# Altium footprint library ICs_rus.PCBLIB: 103 footprints (part 3 of 7)
Each footprint in its own frame and in the unit in brackets; x right, y up, seen from the top. Pads: shape width x height; smd on the part's side, far side on the other; paste and mask are expansions set on the pad; w line width, h text height; cw(c..) or ccw(c..) is an arc to the next point about the centre after c.
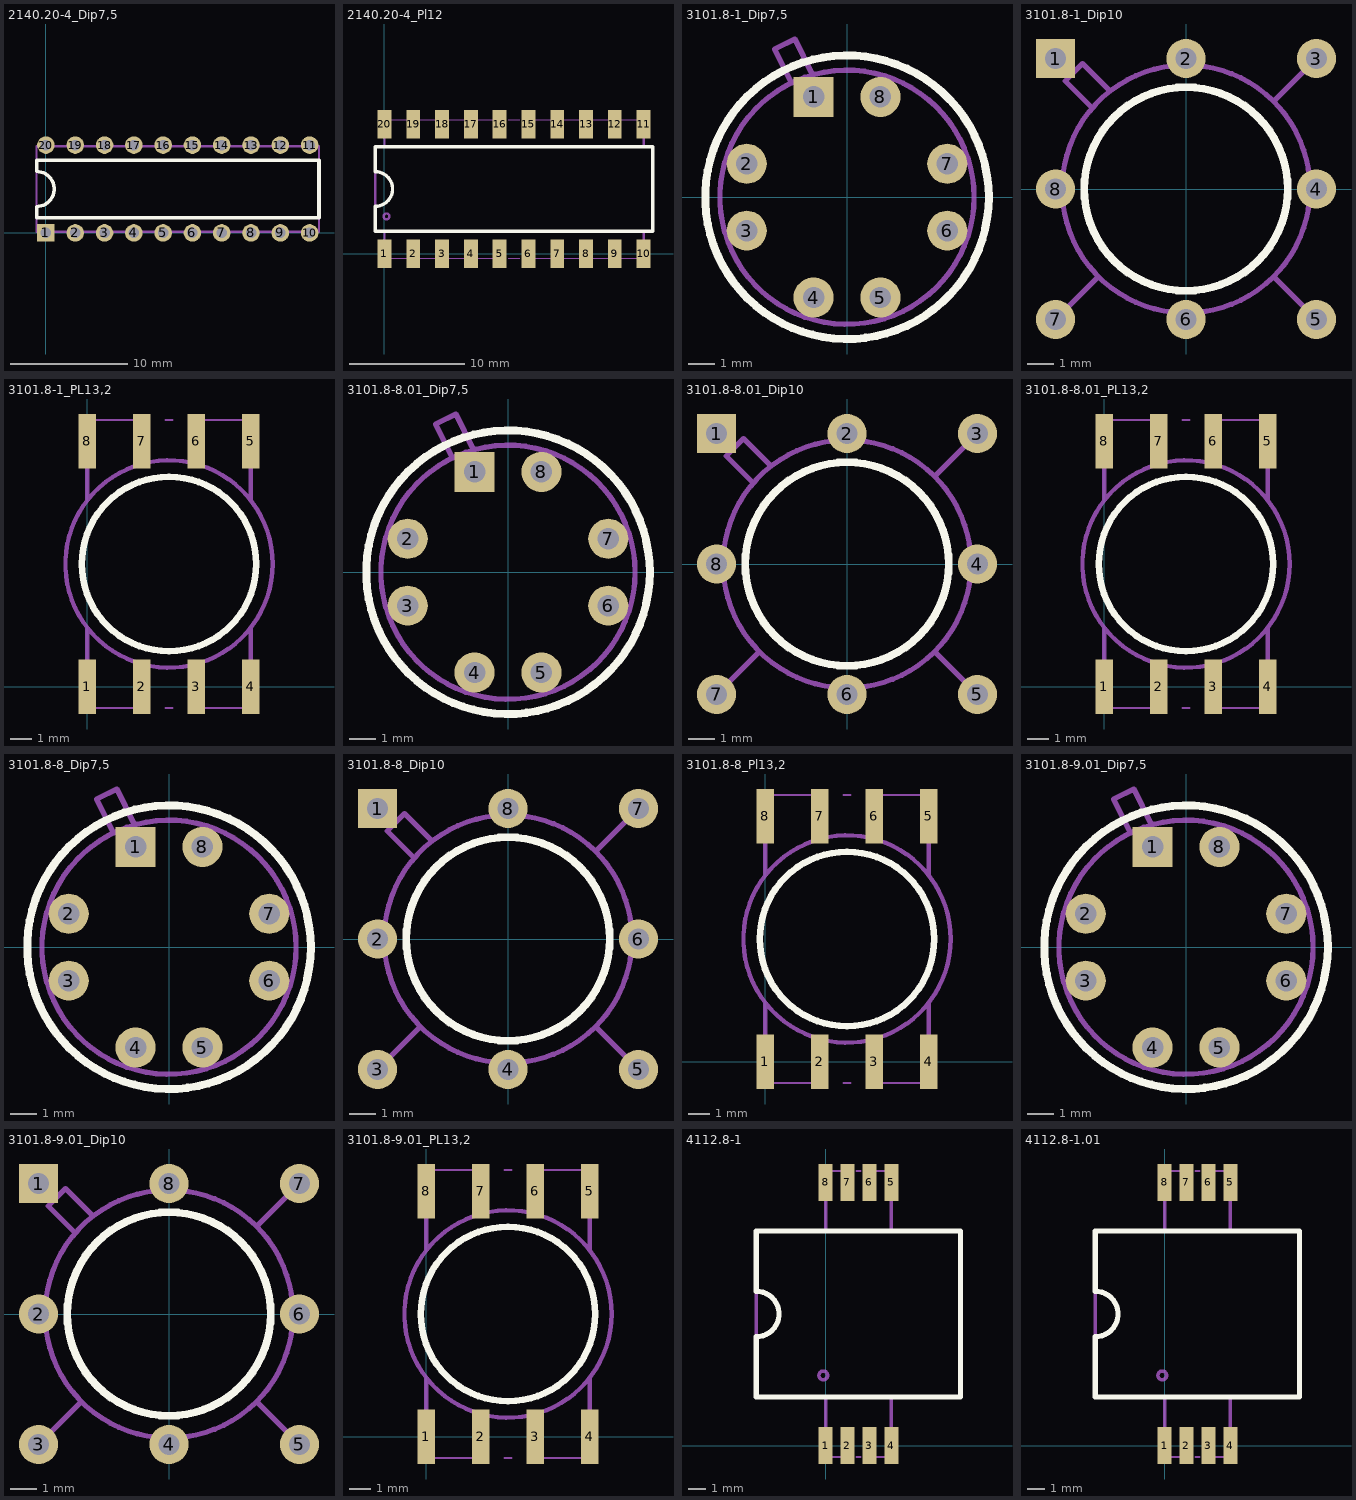
[diagram p2: the footprints below, top view; thin cyan lines are the x and y axes]

## 2140.20-4_Dip7,5 [mm]
height 5
pads (20):
  rect 1.5x1.5 hole 0.9: 1(0,0)
  round 1.5 hole 0.9: 2(2.5,0) 3(5,0) 4(7.5,0) 5(10,0) 6(12.5,0) 7(15,0) 8(17.5,0) 9(20,0) 10(22.5,0) 11(22.5,7.5) 12(20,7.5) 13(17.5,7.5) 14(15,7.5) 15(12.5,7.5) 16(10,7.5) 17(7.5,7.5) 18(5,7.5) 19(2.5,7.5) 20(0,7.5)
Top Overlay:
  lines w0.3: -0.8,1.3 -0.8,2.25 ccw(c-0.8,3.75) -0.8,5.25 -0.8,6.2 23.3,6.2 23.3,1.3 -0.8,1.3
Mechanical 1:
  lines w0.2: -0.8,0.1 -0.8,7.4 23.3,7.4 23.3,0.1 -0.8,0.1
  text ".Designator" at 9.7,4.4 h1.5
  text ".Comment" at 7.8,2.3 h1.5

## 2140.20-4_Pl12 [mm]
height 5
pads (20):
  rect 1.2x2.5 smd: 1(0,0) 2(2.5,0) 3(5,0) 4(7.5,0) 5(10,0) 6(12.5,0) 7(15,0) 8(17.5,0) 9(20,0) 10(22.5,0) 11(22.5,11.25) 12(20,11.25) 13(17.5,11.25) 14(15,11.25) 15(12.5,11.25) 16(10,11.25) 17(7.5,11.25) 18(5,11.25) 19(2.5,11.25) 20(0,11.25)
Top Overlay:
  lines w0.3: -0.8,1.975 23.3,1.975 23.3,9.275 -0.8,9.275 -0.8,7.125 cw(c-0.8,5.625) -0.8,4.125 -0.8,1.975
Mechanical 1:
  circle w0.2: c0.175,3.25 r0.251
  lines w0.1: 0,-0.375 10,-0.375 ; 0,11.625 10,11.625 ; 10.75,-0.375 11.75,-0.375 ; 10.75,11.625 11.75,11.625 ; 12.5,-0.375 22.5,-0.375 ; 12.5,11.625 22.5,11.625
  lines w0.2: 0,-0.375 0,1.975 ; 0,9.275 0,11.625 ; 22.5,-0.375 22.5,1.975 ; 22.5,9.275 22.5,11.625 ; -0.8,1.975 23.3,1.975 23.3,9.275 -0.8,9.275 -0.8,1.975
  text "20" at 0.126,9.368 h2.12

## 3101.8-1_Dip7,5 [mm]
pads (8):
  rect 1.5x1.5 hole 0.8 unplated: 1(-1.25,3.75)
  round 1.5 hole 0.8 unplated: 2(-3.75,1.25) 3(-3.75,-1.25) 4(-1.25,-3.75) 5(1.25,-3.75) 6(3.75,-1.25) 7(3.75,1.25) 8(1.25,3.75)
Top Overlay:
  circle w0.3: c0,0 r5.3
Mechanical 1:
  circle w0.2: c0,0 r4.75
  lines w0.2: -2.08,4.275 -2.705,5.54 -1.945,5.915 -1.29,4.57
  text ".Designator" at -1,0 h1.5
  text ".Comment" at -2.9,-2.1 h1.5
  text "8" at 0.566,1.276 h1.5
3D body: height 8.5, standoff -3, extent -4.7,-4.7 4.69,5.185

## 3101.8-1_Dip10 [mm]
pads (8):
  rect 1.5x1.5 hole 0.8 unplated: 1(-5,5)
  round 1.5 hole 0.8 unplated: 2(0,5) 3(5,5) 4(5,0) 5(5,-5) 6(0,-5) 7(-5,-5) 8(-5,0)
Top Layer:
  lines w0.2: -5,5 -4.4,4.4 -5,5
Top Overlay:
  circle w0.3: c0,0 r3.9
Mechanical 1:
  circle w0.2: c0,0 r4.75
  lines w0.2: -5,-5 -3.375,-3.375 ; -5,0 -4.75,0 ; -5,5 -4.4,4.4 ; -3.595,3.1 -4.63,4.145 -3.97,4.805 -2.91,3.755 ; 0,-5 0,-4.75 ; 0,4.75 0,5 ; 3.375,-3.375 5,-5 ; 3.375,3.375 5,5 ; 4.75,0 5,0
  text ".Comment" at -2.8,-1.8 h1.5
  text ".Designator" at -0.9,0.3 h1.5
3D body: height 8.5, standoff -3, extent -5.2,-5.3 5.3,5.2

## 3101.8-1_PL13,2 [mm]
pads (8):
  rect 0.8x2.5 smd: 1(0,0) 2(2.5,0) 3(5,0) 4(7.5,0) 5(7.5,11.25) 6(5,11.25) 7(2.5,11.25) 8(0,11.25)
Top Overlay:
  circle w0.3: c3.75,5.625 r4
Mechanical 1:
  circle w0.2: c3.75,5.625 r4.75
  lines w0.1: 0,-0.975 2.5,-0.975 ; 0,12.225 2.5,12.225 ; 3.6,-0.975 3.9,-0.975 ; 3.6,12.225 3.9,12.225 ; 5,-0.975 7.5,-0.975 ; 5,12.225 7.5,12.225
  lines w0.2: 0,-0.975 0,2.7 ; 0,8.55 0,12.225 ; 7.5,-0.975 7.5,2.7 ; 7.5,8.55 7.5,12.225
  text ".Designator" at 2.7,5.8 h1.5
  text ".Comment" at 0.8,3.7 h1.5
  text "1" at 0.026,-0.804 h1.5
  text "8" at 0.026,9.821 h1.5
3D body: height 7.3, standoff 0, extent -1.2,-1 8.482,12.2

## 3101.8-8.01_Dip7,5 [mm]
pads (8):
  rect 1.5x1.5 hole 0.8 unplated: 1(-1.25,3.75)
  round 1.5 hole 0.8 unplated: 2(-3.75,1.25) 3(-3.75,-1.25) 4(-1.25,-3.75) 5(1.25,-3.75) 6(3.75,-1.25) 7(3.75,1.25) 8(1.25,3.75)
Top Overlay:
  circle w0.3: c0,0 r5.3
Mechanical 1:
  circle w0.2: c0,0 r4.75
  lines w0.2: -2.08,4.275 -2.705,5.54 -1.945,5.915 -1.29,4.57
  text "8" at 0.566,1.276 h1.5
  text ".Comment" at -2.9,-2.2 h1.5
  text ".Designator" at -1,-0.1 h1.5
3D body: height 8.5, standoff -3, extent -4.7,-4.7 4.69,5.185

## 3101.8-8.01_Dip10 [mm]
pads (8):
  rect 1.5x1.5 hole 0.8 unplated: 1(-5,5)
  round 1.5 hole 0.8 unplated: 2(0,5) 3(5,5) 4(5,0) 5(5,-5) 6(0,-5) 7(-5,-5) 8(-5,0)
Top Layer:
  lines w0.2: -5,5 -4.4,4.4 -5,5
Top Overlay:
  circle w0.3: c0,0 r3.9
Mechanical 1:
  circle w0.2: c0,0 r4.75
  lines w0.2: -5,-5 -3.375,-3.375 ; -5,0 -4.75,0 ; -5,5 -4.4,4.4 ; -3.595,3.1 -4.63,4.145 -3.97,4.805 -2.91,3.755 ; 0,-5 0,-4.75 ; 0,4.75 0,5 ; 3.375,-3.375 5,-5 ; 3.375,3.375 5,5 ; 4.75,0 5,0
  text ".Comment" at -3.1,-1.5 h1.5
  text ".Designator" at -1.2,0.6 h1.5
3D body: height 8.5, standoff -3, extent -5.3,-5.3 5.2,5.2

## 3101.8-8.01_PL13,2 [mm]
pads (8):
  rect 0.8x2.5 smd: 1(0,0) 2(2.5,0) 3(5,0) 4(7.5,0) 5(7.5,11.25) 6(5,11.25) 7(2.5,11.25) 8(0,11.25)
Top Overlay:
  circle w0.3: c3.75,5.625 r4
Mechanical 1:
  circle w0.2: c3.75,5.625 r4.75
  lines w0.1: 0,-0.975 2.5,-0.975 ; 0,12.225 2.5,12.225 ; 3.6,-0.975 3.9,-0.975 ; 3.6,12.225 3.9,12.225 ; 5,-0.975 7.5,-0.975 ; 5,12.225 7.5,12.225
  lines w0.2: 0,-0.975 0,2.7 ; 0,8.55 0,12.225 ; 7.5,-0.975 7.5,2.7 ; 7.5,8.55 7.5,12.225
  text "1" at 0.026,-0.804 h1.5
  text "8" at 0.026,9.821 h1.5
  text ".Comment" at 0.9,4 h1.5
  text ".Designator" at 2.8,6.1 h1.5
3D body: height 7.3, standoff 0, extent -1.3,-1 8.382,12.2

## 3101.8-8_Dip7,5 [mm]
pads (8):
  rect 1.5x1.5 hole 0.8 unplated: 1(-1.25,3.75)
  round 1.5 hole 0.8 unplated: 2(-3.75,1.25) 3(-3.75,-1.25) 4(-1.25,-3.75) 5(1.25,-3.75) 6(3.75,-1.25) 7(3.75,1.25) 8(1.25,3.75)
Top Overlay:
  circle w0.3: c0,0 r5.3
Mechanical 1:
  circle w0.2: c0,0 r4.75
  lines w0.2: -2.08,4.275 -2.705,5.54 -1.945,5.915 -1.29,4.57
  text "8" at 0.562,0.823 h1.5
  text ".Comment" at -3,-2.3 h1.5
  text ".Designator" at -1.1,-0.2 h1.5
3D body: height 8.5, standoff -3, extent -4.7,-4.7 4.69,5.185

## 3101.8-8_Dip10 [mm]
pads (8):
  rect 1.5x1.5 hole 0.8 unplated: 1(-5,5)
  round 1.5 hole 0.8 unplated: 2(-5,0) 3(-5,-5) 4(0,-5) 5(5,-5) 6(5,0) 7(5,5) 8(0,5)
Top Layer:
  lines w0.2: -5,5 -4.4,4.4 -5,5
Top Overlay:
  circle w0.3: c0,0 r3.9
Mechanical 1:
  circle w0.2: c0,0 r4.75
  lines w0.2: -5,-5 -3.375,-3.375 ; -5,0 -4.75,0 ; -5,5 -4.4,4.4 ; -3.595,3.1 -4.63,4.145 -3.97,4.805 -2.91,3.755 ; 0,-5 0,-4.75 ; 0,4.75 0,5 ; 3.375,-3.375 5,-5 ; 3.375,3.375 5,5 ; 4.75,0 5,0
  text "8" at -0.688,1.823 h1.5
  text ".Comment" at -3.2,-1.9 h1.5
  text ".Designator" at -1.3,0.2 h1.5
3D body: height 8.5, standoff -3, extent -5.3,-5.3 5.2,5.2

## 3101.8-8_Pl13,2 [mm]
pads (8):
  rect 0.8x2.5 smd: 1(0,0) 2(2.5,0) 3(5,0) 4(7.5,0) 5(7.5,11.25) 6(5,11.25) 7(2.5,11.25) 8(0,11.25)
Top Overlay:
  circle w0.3: c3.75,5.625 r4
Mechanical 1:
  circle w0.2: c3.75,5.625 r4.75
  lines w0.1: 0,-0.975 2.5,-0.975 ; 0,12.225 2.5,12.225 ; 3.6,-0.975 3.9,-0.975 ; 3.6,12.225 3.9,12.225 ; 5,-0.975 7.5,-0.975 ; 5,12.225 7.5,12.225
  lines w0.2: 0,-0.975 0,2.7 ; 0,8.55 0,12.225 ; 7.5,-0.975 7.5,2.7 ; 7.5,8.55 7.5,12.225
  text "8" at 0,9.9 h1.5
  text "1" at 0,-0.7 h1.5
  text ".Comment" at 0.8,4 h1.5
  text ".Designator" at 2.7,6.1 h1.5
3D body: height 7.3, standoff 0, extent -1.3,-1 8.382,12.2

## 3101.8-9.01_Dip7,5 [mm]
pads (8):
  rect 1.5x1.5 hole 0.8 unplated: 1(-1.25,3.75)
  round 1.5 hole 0.8 unplated: 2(-3.75,1.25) 3(-3.75,-1.25) 4(-1.25,-3.75) 5(1.25,-3.75) 6(3.75,-1.25) 7(3.75,1.25) 8(1.25,3.75)
Top Overlay:
  circle w0.3: c0,0 r5.3
Mechanical 1:
  circle w0.2: c0,0 r4.75
  lines w0.2: -2.08,4.275 -2.705,5.54 -1.945,5.915 -1.29,4.57
  text "8" at 0.566,1.276 h1.5
  text ".Comment" at -2.7,-2 h1.5
  text ".Designator" at -0.8,0.1 h1.5
3D body: height 8.5, standoff -3, extent -4.7,-4.7 4.69,5.185

## 3101.8-9.01_Dip10 [mm]
pads (8):
  rect 1.5x1.5 hole 0.8 unplated: 1(-5,5)
  round 1.5 hole 0.8 unplated: 2(-5,0) 3(-5,-5) 4(0,-5) 5(5,-5) 6(5,0) 7(5,5) 8(0,5)
Top Layer:
  lines w0.2: -5,5 -4.4,4.4 -5,5
Top Overlay:
  circle w0.3: c0,0 r3.9
Mechanical 1:
  circle w0.2: c0,0 r4.75
  lines w0.2: -5,-5 -3.375,-3.375 ; -5,0 -4.75,0 ; -5,5 -4.4,4.4 ; -3.595,3.1 -4.63,4.145 -3.97,4.805 -2.91,3.755 ; 0,-5 0,-4.75 ; 0,4.75 0,5 ; 3.375,-3.375 5,-5 ; 3.375,3.375 5,5 ; 4.75,0 5,0
  text "8" at -0.684,2.276 h1.5
  text ".Comment" at -3,-1.7 h1.5
  text ".Designator" at -1.1,0.4 h1.5
3D body: height 8.5, standoff -3, extent -5.3,-5.3 5.2,5.2

## 3101.8-9.01_PL13,2 [mm]
pads (8):
  rect 0.8x2.5 smd: 1(0,0) 2(2.5,0) 3(5,0) 4(7.5,0) 5(7.5,11.25) 6(5,11.25) 7(2.5,11.25) 8(0,11.25)
Top Overlay:
  circle w0.3: c3.75,5.625 r4
Mechanical 1:
  circle w0.2: c3.75,5.625 r4.75
  lines w0.1: 0,-0.975 2.5,-0.975 ; 0,12.225 2.5,12.225 ; 3.6,-0.975 3.9,-0.975 ; 3.6,12.225 3.9,12.225 ; 5,-0.975 7.5,-0.975 ; 5,12.225 7.5,12.225
  lines w0.2: 0,-0.975 0,2.7 ; 0,8.55 0,12.225 ; 7.5,-0.975 7.5,2.7 ; 7.5,8.55 7.5,12.225
  text "8" at 0.026,9.821 h1.5
  text "1" at 0.026,-0.804 h1.5
  text ".Comment" at 0.8,4 h1.5
  text ".Designator" at 2.7,6.1 h1.5
3D body: height 7.3, standoff 0, extent -1.2,-1 8.482,12.2

## 4112.8-1 [mm]
pads (8):
  rect 0.8x2.1 smd: 1(0,0) 2(1.25,0) 3(2.5,0) 4(3.75,0) 5(3.75,15) 6(2.5,15) 7(1.25,15) 8(0,15)
Top Overlay:
  lines w0.3: -3.95,2.775 7.7,2.775 7.7,12.225 -3.95,12.225 -3.95,8.8 cw(c-3.95,7.5) -3.95,6.2 -3.95,2.775
Mechanical 1:
  circle w0.2: c-0.125,4 r0.25
  lines w0.1: 0,-0.65 1.075,-0.65 ; 0,15.65 1.075,15.65 ; 1.75,-0.65 2,-0.65 ; 1.75,15.65 2,15.65 ; 2.675,-0.65 3.75,-0.65 ; 2.675,15.65 3.75,15.65
  lines w0.2: 0,-0.65 0,2.775 ; 0,12.225 0,15.65 ; 3.75,-0.65 3.75,2.775 ; 3.75,12.225 3.75,15.65 ; -3.95,2.775 7.7,2.775 7.7,12.225 -3.95,12.225 -3.95,2.775
  text "8" at 0.147,12.493 h1.5
  text ".Comment" at -1.1,6.3 h1.5
  text ".Designator" at 0.8,8.4 h1.5
3D body: height 2.5, standoff 0, extent -4,-0.6 7.7,15.7

## 4112.8-1.01 [mm]
height 2.5
pads (8):
  rect 0.8x2.1 smd: 1(0,0) 2(1.25,0) 3(2.5,0) 4(3.75,0) 5(3.75,15) 6(2.5,15) 7(1.25,15) 8(0,15)
Top Overlay:
  lines w0.3: -3.95,2.775 -3.95,6.2 ccw(c-3.95,7.5) -3.95,8.8 -3.95,12.225 7.7,12.225 7.7,2.775 -3.95,2.775
Mechanical 1:
  circle w0.2: c-0.125,4 r0.25
  lines w0.1: 0,-0.65 1.075,-0.65 ; 0,15.65 1.075,15.65 ; 1.75,-0.65 2,-0.65 ; 1.75,15.65 2,15.65 ; 2.675,-0.65 3.75,-0.65 ; 2.675,15.65 3.75,15.65
  lines w0.2: 0,-0.65 0,2.775 ; 0,12.225 0,15.65 ; 3.75,-0.65 3.75,2.775 ; 3.75,12.225 3.75,15.65 ; -3.95,2.775 -3.95,12.225 7.7,12.225 7.7,2.775 -3.95,2.775
  text ".Designator" at 0.8,8.4 h1.5
  text ".Comment" at -1.1,6.3 h1.5
  text "8" at 0.147,12.493 h1.5
3D body: height 2.5, standoff 0, extent -4,-0.6 7.7,15.7